# Altium footprint library CONNECTORS.PcbLib: 55 footprints (part 1 of 4)
Each footprint in its own frame and in the unit in brackets; x right, y up, seen from the top. Pads: shape width x height; smd on the part's side, far side on the other; paste and mask are expansions set on the pad; w line width, h text height; cw(c..) or ccw(c..) is an arc to the next point about the centre after c.
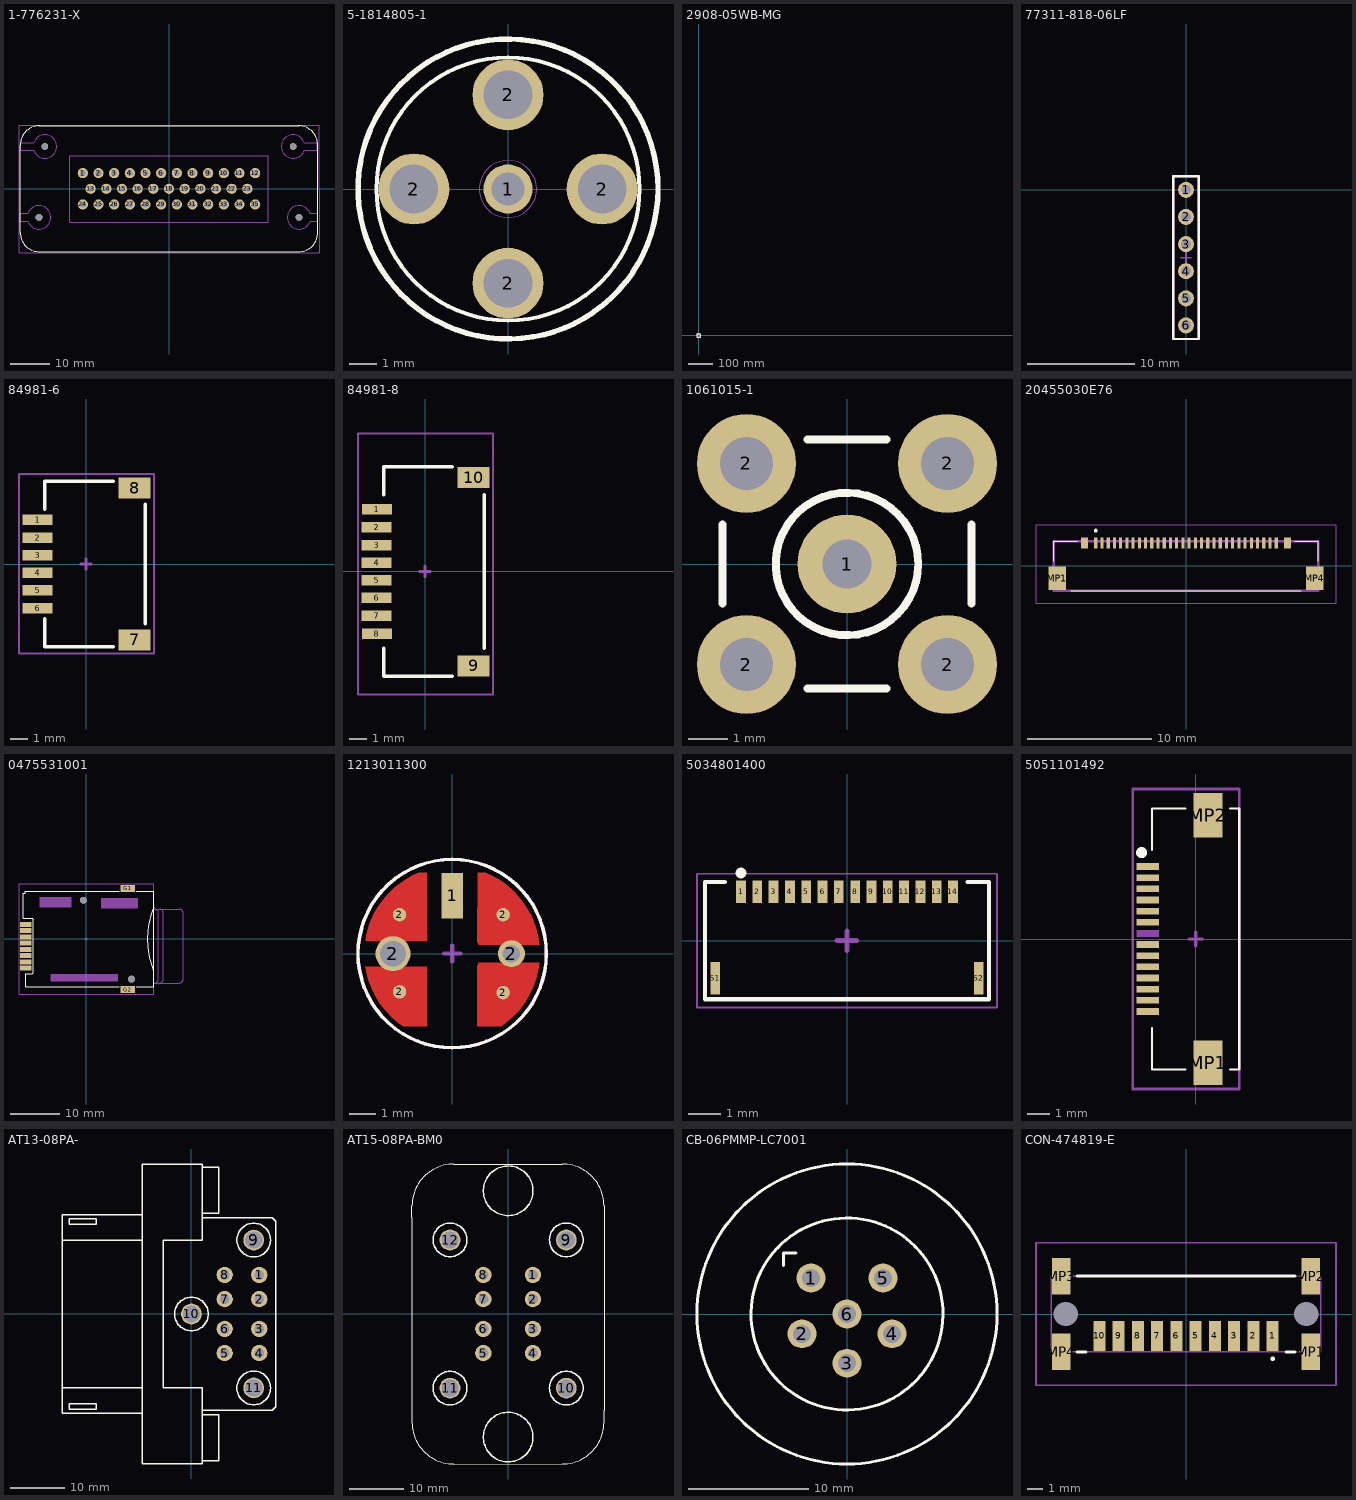
[diagram p0: the footprints below, top view; thin cyan lines are the x and y axes]

## 1-776231-X [mm]
pads (39):
  round 2.6 hole 1.5: 1(-22,4) 2(-18,4) 3(-14,4) 4(-10,4) 5(-6,4) 6(-2,4) 7(2,4) 8(6,4) 9(10,4) 10(14,4) 11(18,4) 12(22,4) 13(-20,0) 14(-16,0) 15(-12,0) 16(-8,0) 17(-4,0) 18(0,0) 19(4,0) 20(8,0) 21(12,0) 22(16,0) 23(20,0) 24(-22,-4) 25(-18,-4) 26(-14,-4) 27(-10,-4) 28(-6,-4) 29(-2,-4) 30(2,-4) 31(6,-4) 32(10,-4) 33(14,-4) 34(18,-4) 35(22,-4)
  round 1.7 hole 1.7 unplated: 36(-31.7,10.8) 38(-33.2,-7.3) 38(31.7,10.8) 39(33.2,-7.3)
Top Overlay:
  lines w0.254: -37.973,-11.303 -37.973,11.176 ; -37.973,11.253 cw(c-33.173,11.252) -33.172,16.052 ; -37.971,-11.251 ccw(c-33.171,-11.252) -33.172,-16.052 ; -33.2,-16.05 33.2,-16.05 ; -33.2,16.05 33.2,16.049 ; 33.172,-16.052 ccw(c33.173,-11.252) 37.973,-11.253 ; 33.172,16.052 cw(c33.171,11.252) 37.971,11.251 ; 37.973,-11.176 37.973,11.176
Mechanical 1:
  lines w0.254: -37.973,-8.35 -37.973,-6.35 ; -37.973,9.8 -34.544,9.8 ; -37.95,-8.3 -36,-8.3 ; -37.95,-6.3 -36,-6.3 ; -37.9,9.811 -37.9,11.811 -34.544,11.811 ; -36.033,-8.288 ccw(c-33.2,-7.3) -36.033,-6.312 ; -34.533,9.812 ccw(c-31.7,10.8) -34.533,11.788 ; 34.533,9.812 cw(c31.7,10.8) 34.533,11.788 ; 34.544,9.789 37.846,9.789 ; 34.544,11.8 37.9,11.8 37.9,9.789 ; 36,-8.3 37.95,-8.3 ; 36,-6.3 37.95,-6.3 ; 36.033,-8.288 cw(c33.2,-7.3) 36.033,-6.312 ; 37.973,-8.25 37.973,-6.25 ; -25.4,-8.5 25.4,-8.5 25.4,8.5 -25.4,8.5 -25.4,-8.5
Top Assembly:
  lines w0.127: -38.3,-16.325 38.3,-16.325 38.3,16.225 -38.3,16.225 -38.3,-16.325
  text ".Designator" at -5.1,-1.35 h3
3D body "1-776231-1.STEP": height 34.25, standoff -3.8, extent -38.45,-16.05 38.45,16.05

## 5-1814805-1 [mm]
pads (5):
  round 1.8 hole 1.2: 1(0,0)
  round 2.6 hole 1.78: 2(-3.45,0) 2(0,-3.45) 2(0,3.45) 2(3.45,0)
Top Overlay:
  circle w0.2: c0,0 r5.5
  circle w0.15: c0,0 r4.825
Mechanical 1:
  circle w0.025: c0,0 r1.05
  circle w0.025: c-0.035,-0.035 r0.2
3D body "c-5-1814805-1-b-3d.stp": height 18.8, standoff -3.6, extent -7.779,-7.779 7.779,7.779

## 2908-05WB-MG [mm]
pads (12):
  rect 0.8x1.5 smd: 1(-1.8,3.375) 2(-0.7,2.975) 3(0.4,3.375) 4(1.5,3.575) 5(2.6,3.375) 6(3.7,3.575) 7(4.8,3.375) 8(5.9,3.375)
  rect 2x2 smd: 9(5.1,-7.225) 10(-0.6,-7.225)
  rect 1.4x1.9 smd: 11(6.7,6.225) 12(-6.45,7.225)
Top Overlay:
  lines w0.254: -6.85,5.975 -6.85,-6.868 -5.509,-6.868 -5.509,-7.325 -1.85,-7.325 ; -5.5,7.875 -4.85,7.875 -4.85,7.661 ; -4.839,7.568 cw(c-5.141,6.614) -4.196,6.943 ; -4.199,6.942 ccw(c-3.381,7.516) -3.324,6.518 5.413,6.518 5.769,6.874 ; 0.65,-7.325 3.8,-7.325 ; 6.4,-7.325 7.15,-7.325 7.15,4.975
Top Assembly:
  lines w0.127: -7.325,-8.4 7.575,-8.4 7.575,8.35 -7.325,8.35 -7.325,-8.4
  text ".Designator" at -2.775,-0.45 h1
Top Component Center:
  lines w0.15: -0.302,0 0.298,0 ; -0.002,-0.3 -0.002,0.3
Top Auxiliary Drawings:
  lines w0.127: -4.1,1.041 ccw(c-3.7,1.041) -3.983,0.758 -2.917,-0.308 cw(c-3.2,-0.591) -2.8,-0.591 -2.8,-4.725 ccw(c-2,-4.725) -2,-5.525 6.1,-5.525 ccw(c6.1,-4.725) 6.9,-4.725 6.9,5.045 ; -4.1,1.041 -4.1,2.275 ; -4.1,2.275 cw(c-4,2.275) -4,2.375 -3.6,2.375 ccw(c-3.6,2.575) -3.4,2.575 -3.4,3.409 ccw(c-3.8,3.409) -3.517,3.692 -4.1,4.275 -4.1,8.675 cw(c-3.3,8.675) -3.3,9.475 6.1,9.475 cw(c6.1,8.675) 6.9,8.675 6.9,7.382 ; 1.4,-7.325 1.4,2.581 ; 1.4,4.613 1.4,9.475
3D body: height 0.25, standoff 0, extent -47.325,-43.925 -47.325,-43.925
3D body "2908-05WB-MG.STEP": height 1.85, standoff 0, extent -6.85,-7.6 7.15,7.6

## 77311-818-06LF [mm]
pads (6):
  round 1.5 hole 0.9: 1(0,0) 2(0,-2.54) 3(0,-5.08) 4(0,-7.62) 5(0,-10.16) 6(0,-12.7)
Top Overlay:
  lines w0.203: -1.2,-13.97 -1.2,1.27 1.2,1.27 1.2,-13.97 -1.2,-13.97
Mechanical 1:
  pour cut-out: -0.85,14.125
Top Assembly:
  lines w0.203: -1.2,-13.965 1.2,-13.965 1.2,1.275 -1.2,1.275 -1.2,-13.965
  text ".Designator" at -0.325,-1.45 h1
Top Component Center:
  lines w0.152: -0.5,-6.35 0.5,-6.35 ; 0,-6.85 0,-5.85
3D body "77311-818-06LF.stp": height 8.4, standoff -3.1, extent -1.225,-13.77 1.185,1.07

## 84981-6 [mm]
pads (8):
  rect 1.7x0.6 smd: 1(-2.75,2.5) 2(-2.75,1.5) 3(-2.75,0.5) 4(-2.75,-0.5) 5(-2.75,-1.5) 6(-2.75,-2.5)
  rect 1.8x1.2 smd: 7(2.75,-4.3) 8(2.75,4.3)
Top Overlay:
  lines w0.2: -2.35,-3.1 -2.35,-4.7 1.55,-4.7 ; -2.35,3.1 -2.35,4.7 1.55,4.7 ; 3.35,-3.4 3.35,3.4
Top Assembly:
  lines w0.127: -3.8,-5.075 -3.8,5.1 3.85,5.1 3.85,-5.075 -3.8,-5.075
  text ".Designator" at -0.275,2.45 h1
Top Component Center:
  lines w0.15: -0.302,0 0.298,0 ; -0.002,-0.3 -0.002,0.3
3D body "84981-6.stp": height 3, standoff -0.05, extent -2.9,-4.5 3.4,4.5

## 84981-8 [mm]
pads (10):
  rect 1.7x0.6 smd: 1(-2.725,3.525) 2(-2.75,2.5) 3(-2.75,1.5) 4(-2.75,0.5) 5(-2.75,-0.5) 6(-2.75,-1.5) 7(-2.75,-2.5) 8(-2.725,-3.525)
  rect 1.8x1.2 smd: 9(2.75,-5.35) 10(2.75,5.325)
Top Overlay:
  lines w0.2: -2.35,-4.35 -2.35,-5.95 1.55,-5.95 ; -2.35,4.35 -2.35,5.95 1.55,5.95 ; 3.35,-4.35 3.35,4.35
Top Assembly:
  lines w0.127: -3.8,-6.975 -3.8,7.825 3.85,7.825 3.85,-6.975 -3.8,-6.975
  text ".Designator" at -0.275,2.45 h1
Top Component Center:
  lines w0.15: -0.302,0 0.298,0 ; -0.002,-0.3 -0.002,0.3
3D body "84981-8.stp": height 3, standoff -0.05, extent -3,-5.5 3.3,5.5

## 1061015-1 [mm]
pads (5):
  round 2.5 hole 1.25: 1(0,0)
  round 2.5 hole 1.35: 2(-2.54,-2.54) 2(-2.54,2.54) 2(2.54,-2.54) 2(2.54,2.54)
Top Overlay:
  circle w0.2: c0,0 r1.8
  lines w0.2: -3.15,-1 -3.15,1 ; -1,-3.15 1,-3.15 ; -1,3.15 1,3.15 ; 3.15,-1 3.15,1
Mechanical 1:
  circle w0.025: c0,0 r0.2
  circle w0.025: c0,0 r1.05
  circle w0.025: c0,0 r1.8
3D body "c-1061015-1-a-3d.stp": height 5.73, standoff -3.93, extent -2.997,-2.997 2.997,2.997

## 20455030E76 [mm]
pads (34):
  rect 0.25x0.9 smd: 1(-7.25,1.845) 2(-6.75,1.845) 3(-6.25,1.845) 4(-5.75,1.845) 5(-5.25,1.845) 6(-4.75,1.845) 7(-4.25,1.845) 8(-3.75,1.845) 9(-3.25,1.845) 10(-2.75,1.845) 11(-2.25,1.845) 12(-1.75,1.845) 13(-1.25,1.845) 14(-0.75,1.845) 15(-0.25,1.845) 16(0.25,1.845) 17(0.75,1.845) 18(1.25,1.845) 19(1.75,1.845) 20(2.25,1.845) 21(2.75,1.845) 22(3.25,1.845) 23(3.75,1.845) 24(4.25,1.845) 25(4.75,1.845) 26(5.25,1.845) 27(5.75,1.845) 28(6.25,1.845) 29(6.75,1.845) 30(7.25,1.845)
  rect 1.4x1.9 smd: MP1(-10.35,-0.975) MP4(10.35,-0.975)
  rect 0.55x0.9 smd: MP2(-8.15,1.845) MP3(8.15,1.845)
Top Overlay:
  lines w0.1: -10.625,1.975 -8.75,1.975 -10.625,1.975 ; -10.625,1.975 -10.625,0.395 -10.625,1.975 ; 10.625,1.975 10.625,0.395 10.625,1.975 ; 10.625,1.975 8.75,1.975 10.625,1.975 ; -9.25,-1.975 9.25,-1.975 -9.25,-1.975
  lines w0.2: -7.25,2.795 ccw(c-7.25,2.845) -7.25,2.895 ; -7.25,2.795 cw(c-7.25,2.845) -7.25,2.895 ; -7.25,2.795 ccw(c-7.25,2.845) -7.25,2.895
Top Assembly:
  text ".Designator" at -5.693,-0.648 h1
Mechanical 13:
  lines w0.2: -10.625,-1.975 10.625,-1.975 10.625,1.975 -10.625,1.975 -10.625,-1.975
Mechanical 15:
  lines w0.1: -12.05,-2.975 12.05,-2.975 12.05,3.295 -12.05,3.295 -12.05,-2.975
3D body "20455-030E-76.stp": height 1.2, standoff 0, extent -10.91,-1.975 10.91,2.27

## 0475531001 [mm]
pads (12):
  round 1.4 hole 1.4 unplated: 0(-0.602,7.882) 0(9.198,-8.168)
  rect 2.3x1 smd: C1(-12.272,2.982) C2(-12.272,0.442) C3(-12.272,-2.098) C5(-12.272,1.712) C6(-12.272,-0.828) C7(-12.272,-3.368) CD0(-12.272,-4.638) CD1(-12.272,-5.908)
  rect 2.95x1.5 smd: G1(8.428,10.272) G2(8.428,-10.278)
Top Overlay:
  lines w0.2: 6.698,-9.678 -12.272,-9.678 -12.272,-7.108 -10.972,-7.108 -10.747,-6.883 -10.747,4.022 -10.967,4.242 -12.822,4.242 -12.822,9.272 -12.447,9.272 -12.447,9.622 -12.397,9.672 6.723,9.672 ; 10.138,-9.678 13.678,-9.678 13.678,9.672 10.138,9.672 ; 13.658,-6.412 cw(c29.874,-0.005) 13.667,6.427
Top Assembly:
  lines w0.127: -13.675,-11.2 13.675,-11.2 13.675,11.2 -13.675,11.2 -13.675,-11.2
  text ".Designator" at -1.975,-0.45 h1
Top Component Center:
  lines w0.15: -0.3,-0.002 0.3,-0.002 ; 0,-0.302 0,0.298
Top Glue Points:
  region: 6.5,-8.628 6.5,-7.108 -7.272,-7.108 -7.272,-8.628
  region: 10.5,6.244 10.5,8.372 3.028,8.372 3.028,6.244
  region: -3,6.372 -3,8.5 -9.5,8.5 -9.5,6.372
Top Auxiliary Drawings:
  lines w0.2: 13.928,6.047 cw(c13.928,5.297) 14.678,5.297 14.678,-8.183 cw(c13.903,-8.183) 13.903,-8.958 13.678,-8.958 18.928,-8.958 ccw(c18.928,-8.208) 19.678,-8.208 19.678,5.292 ccw(c18.928,5.292) 18.928,6.042 13.728,6.042 14.028,6.042 ; 14.678,-8.958 14.903,-8.958 ccw(c14.903,-8.183) 15.678,-8.183 15.678,5.297 ccw(c14.928,5.297) 14.928,6.047 ; 14.728,6.042 15.028,6.042
3D body "475531001.stp": height 1.94, standoff -0.56, extent -12.825,-10.425 13.675,10.525

## 1213011300 [mm]
pads (7):
  rect 0.8x1.7 smd: 1(0,2.15)
  round 1.3 hole 0.95 paste+0 mask+0: 2(-2.2,0)
  round 0.5 smd: 2(-1.956,-1.422) 2(-1.956,1.448) 2(1.894,-1.448) 2(1.894,1.448)
  round 1 hole 0.65 paste+0 mask+0: 2(2.2,0)
Top Layer:
  region: -3.219,0.483 -0.949,0.483 -0.944,2.999 -1.25,3.005 -1.443,2.925 -1.806,2.716 -2.139,2.462 -2.437,2.168 -2.695,1.838 -2.908,1.477 -3.073,1.092 -3.188,0.69
  region: 0.984,0.33 3.232,0.33 3.209,0.548 3.107,0.974 2.949,1.382 2.737,1.765 2.476,2.117 2.17,2.43 1.825,2.7 1.447,2.921 1.245,3.005 0.943,3.005 0.937,0.449 0.943,0.435 0.956,0.405 0.968,0.376 0.979,0.345
  region: 0.937,-2.692 1.82,-2.693 1.967,-2.593 2.239,-2.363 2.484,-2.105 2.699,-1.822 2.882,-1.517 3.031,-1.194 3.143,-0.857 3.219,-0.509 3.237,-0.333 0.989,-0.33 0.983,-0.346 0.971,-0.378 0.958,-0.409 0.944,-0.44 0.937,-0.456
  region: -0.939,-2.692 -0.94,-0.483 -3.221,-0.483 -3.197,-0.649 -3.114,-0.976 -2.997,-1.292 -2.847,-1.595 -2.667,-1.879 -2.458,-2.144 -2.222,-2.385 -1.962,-2.599 -1.821,-2.692
Top Overlay:
  circle w0.127: c0,0 r3.5
Top Assembly (Mech4):
  circle w0.127: c0,0 r3.5
  text ".Designator" at -1.524,-0.584 h1
Top Component Center (Mech11):
  lines w0.15: -0.298,0 0.302,0 ; 0.002,-0.3 0.002,0.3
3D body "1213011300.stp": height 6.2, standoff -0.54, extent -2.75,-2.1 2.75,2.55

## 5034801400 [mm]
pads (16):
  rect 0.3x0.7 smd: 1(-3.25,1.5) 2(-2.75,1.5) 3(-2.25,1.5) 4(-1.75,1.5) 5(-1.25,1.5) 6(-0.75,1.5) 7(-0.25,1.5) 8(0.25,1.5) 9(0.75,1.5) 10(1.25,1.5) 11(1.75,1.5) 12(2.25,1.5) 13(2.75,1.5) 14(3.25,1.5)
  rect 0.3x1 smd: S1(-4.04,-1.15) S2(4.04,-1.15)
Top Overlay:
  circle w0.175: c-3.25,2.073 r0.075
  lines w0.127: -3.75,1.8 -4.35,1.8 -4.35,-1.8 4.35,-1.8 4.35,1.8 3.7,1.8
Top Assembly:
  lines w0.05: -4.6,-2.05 -4.6,2.05 4.6,2.05 4.6,-2.05 -4.6,-2.05
Top Component Center:
  lines w0.15: -0.302,0 0.298,0 ; -0.002,-0.3 -0.002,0.3
3D body: height 0.25, standoff 0, extent 0,0 0,0
3D body "5034801400.stp": height 1.85, standoff -0.02, extent -4.35,-1.8 4.35,1.8

## 5051101492 [mm]
pads (16):
  rect 1x0.3 smd: 1(-2.157,3.25) 2(-2.157,2.75) 3(-2.157,2.25) 4(-2.157,1.75) 5(-2.157,1.25) 6(-2.157,0.75) 8(-2.157,-0.25) 9(-2.157,-0.75) 10(-2.157,-1.25) 11(-2.157,-1.75) 12(-2.157,-2.25) 13(-2.157,-2.75) 14(-2.157,-3.25)
  rect 1x0.3 on Mech5: 7(-2.157,0.25)
  rect 1.3x2 smd: MP1(0.543,-5.55) MP2(0.543,5.55)
Top Overlay:
  circle w0.3: c-2.425,3.875 r0.1
  lines w0.1: -1.957,-4 -1.957,-5.85 -0.457,-5.85 ; -1.957,4 -1.957,5.85 -0.457,5.85 ; 1.543,-5.85 1.953,-5.85 1.953,5.85 1.543,5.85
Top Assembly:
  lines w0.127: -2.825,-6.725 -2.825,6.725 1.95,6.725 1.95,-6.725 -2.825,-6.725
Top Component Center:
  lines w0.15: -0.302,0 0.298,0 ; -0.002,-0.3 -0.002,0.3
3D body "505110-1492.stp": height 1.88, standoff -0.02, extent -2.35,-6.25 2.95,6.25

## AT13-08PA- [mm]
pads (11):
  round 3 hole 1.8: 1(12.45,7.175) 2(12.45,2.73) 3(12.45,-2.73) 4(12.45,-7.175) 5(6.1,-7.175) 6(6.1,-2.73) 7(6.1,2.73) 8(6.1,7.175)
  round 3.8 hole 3.2 unplated: 9(11.43,13.59) 11(11.43,-13.59)
  round 3.8 hole 3.2: 10(0,0)
Top Overlay:
  circle w0.254: c11.43,-13.59 r3.091
  circle w0.254: c11.43,13.59 r3.091
  circle w0.254: c0,0 r3.091
  lines w0.254: -23.74,-13.59 -9.02,-13.59 ; -23.635,13.59 -9.15,13.59 ; -9.145,-18.225 -23.75,-18.225 -23.75,18.225 -9.025,18.225 ; -5.225,-13.59 2,-13.59 2,-27.56 -9.02,-27.56 -9.02,27.56 2,27.56 2,13.59 -5.225,13.59 -5.225,-13.55 ; 2,-27 5,-27 5,-18.5 2,-18.5 ; 2,-17.655 14.845,-17.655 15.49,-17.01 15.49,17.01 14.845,17.655 2,17.655 ; 2,18.5 5,18.5 5,27 2,27 ; -22.5,-17.5 -17.5,-17.5 -17.5,-16.5 -22.5,-16.5 -22.5,-17.5 ; -22.5,16.5 -22.5,17.5 -17.5,17.5 -17.5,16.5 -22.5,16.5
Top Assembly:
  text ".Designator" at -5.1,-1.35 h3
3D body "c-dt13-08pa-g003-99-3d.stp": height 35.53, standoff -3.06, extent -23.775,-27.575 15.468,27.543

## AT15-08PA-BM0 [mm]
pads (12):
  round 3 hole 1.8: 1(4.547,7.162) 2(4.547,2.717) 3(4.547,-2.743) 4(4.547,-7.188) 5(-4.553,-7.188) 6(-4.553,-2.743) 7(-4.553,2.717) 8(-4.553,7.162)
  round 3.8 hole 3.2 unplated: 9(10.667,13.567) 10(10.667,-13.613) 11(-10.673,-13.613) 12(-10.673,13.567)
Top Overlay:
  circle w0.254: c0,-22.605 r4.55
  circle w0.254: c0,22.605 r4.55
  circle w0.254: c10.667,13.587 r3.091
  circle w0.254: c10.667,-13.613 r3.091
  circle w0.254: c-10.673,-13.613 r3.091
  circle w0.254: c-10.673,13.587 r3.091
  lines w0.152: -17.657,17.736 -17.655,-19.863 ccw(c-9.975,-19.863) -9.975,-27.543 9.916,-27.543 ccw(c9.916,-19.863) 17.596,-19.863 17.596,-17.714 cw(c17.597,-17.714) 17.597,-17.713 17.597,19.834 ccw(c9.913,19.834) 9.913,27.518 ; -17.654,17.736 -17.654,19.823 cw(c-9.974,19.823) -9.974,27.503 9.913,27.503
Top Assembly:
  text ".Designator" at -15.203,-1.213 h3
3D body "AT15-08PA-BM04.stp": height 30.22, standoff -3.1, extent -17.654,-27.598 17.596,27.522

## CB-06PMMP-LC7001 [mm] "CONN PANEL LOCK 6PIN M"
height 17
pads (6):
  round 2.4 hole 1.5: 1(-3,3) 2(-3.75,-1.65) 3(0,-4.1) 4(3.75,-1.65) 5(3,3) 6(0,0)
Top Overlay:
  circle w0.254: c0,0 r12.5
  lines w0.254: -6.613,-4.503 cw(c0,0) -6.592,-4.533 ; -5.283,4.064 -5.283,5.08 -4.267,5.08
3D body "CB-06PMMP-LC7001.stp": height 16, standoff -5.9, extent -12.5,-12.497 12.5,12.497

## CON-474819-E [mm] "MIBR M 10POS VERT P SMT KS"
height 6.1
pads (16):
  rect 0.8x2 smd: 1(5.715,-1.45) 2(4.445,-1.45) 3(3.175,-1.45) 4(1.905,-1.45) 5(0.635,-1.45) 6(-0.635,-1.45) 7(-1.905,-1.45) 8(-3.175,-1.45) 9(-4.445,-1.45) 10(-5.715,-1.45)
  round 0.8 hole 1.6 unplated: MH1(7.925,0) MH2(-7.925,0)
  rect 1.2x2.4 smd: MP1(8.225,-2.5) MP2(8.225,2.5) MP3(-8.225,2.5) MP4(-8.225,-2.5)
Top Overlay:
  lines w0.2: -7.2,-2.5 -6.6,-2.5 ; -7.2,2.5 7.2,2.5 ; 6.6,-2.5 7.2,-2.5 ; 5.715,-3 cw(c5.715,-2.95) 5.715,-2.9 ; 5.715,-3 ccw(c5.715,-2.95) 5.715,-2.9 ; 5.715,-3 5.715,-2.9
Mechanical 15:
  lines w0.1: -8.89,-2.5 8.89,-2.5 8.89,2.5 -8.89,2.5 -8.89,-2.5
Mechanical 20:
  lines w0.1: -9.89,-4.7 9.89,-4.7 9.89,4.7 -9.89,4.7 -9.89,-4.7
3D body: height 0.25, standoff 0, extent -4.318,3.429 -4.318,3.429
3D body "474819.stp": height 5.2, standoff -0.8, extent -8.763,-3.373 9.017,3.627